# Altium footprint library pcb_Active.PcbLib: 86 footprints (part 3 of 6)
Each footprint in its own frame and in the unit in brackets; x right, y up, seen from the top. Pads: shape width x height; smd on the part's side, far side on the other; paste and mask are expansions set on the pad; w line width, h text height; cw(c..) or ccw(c..) is an arc to the next point about the centre after c.
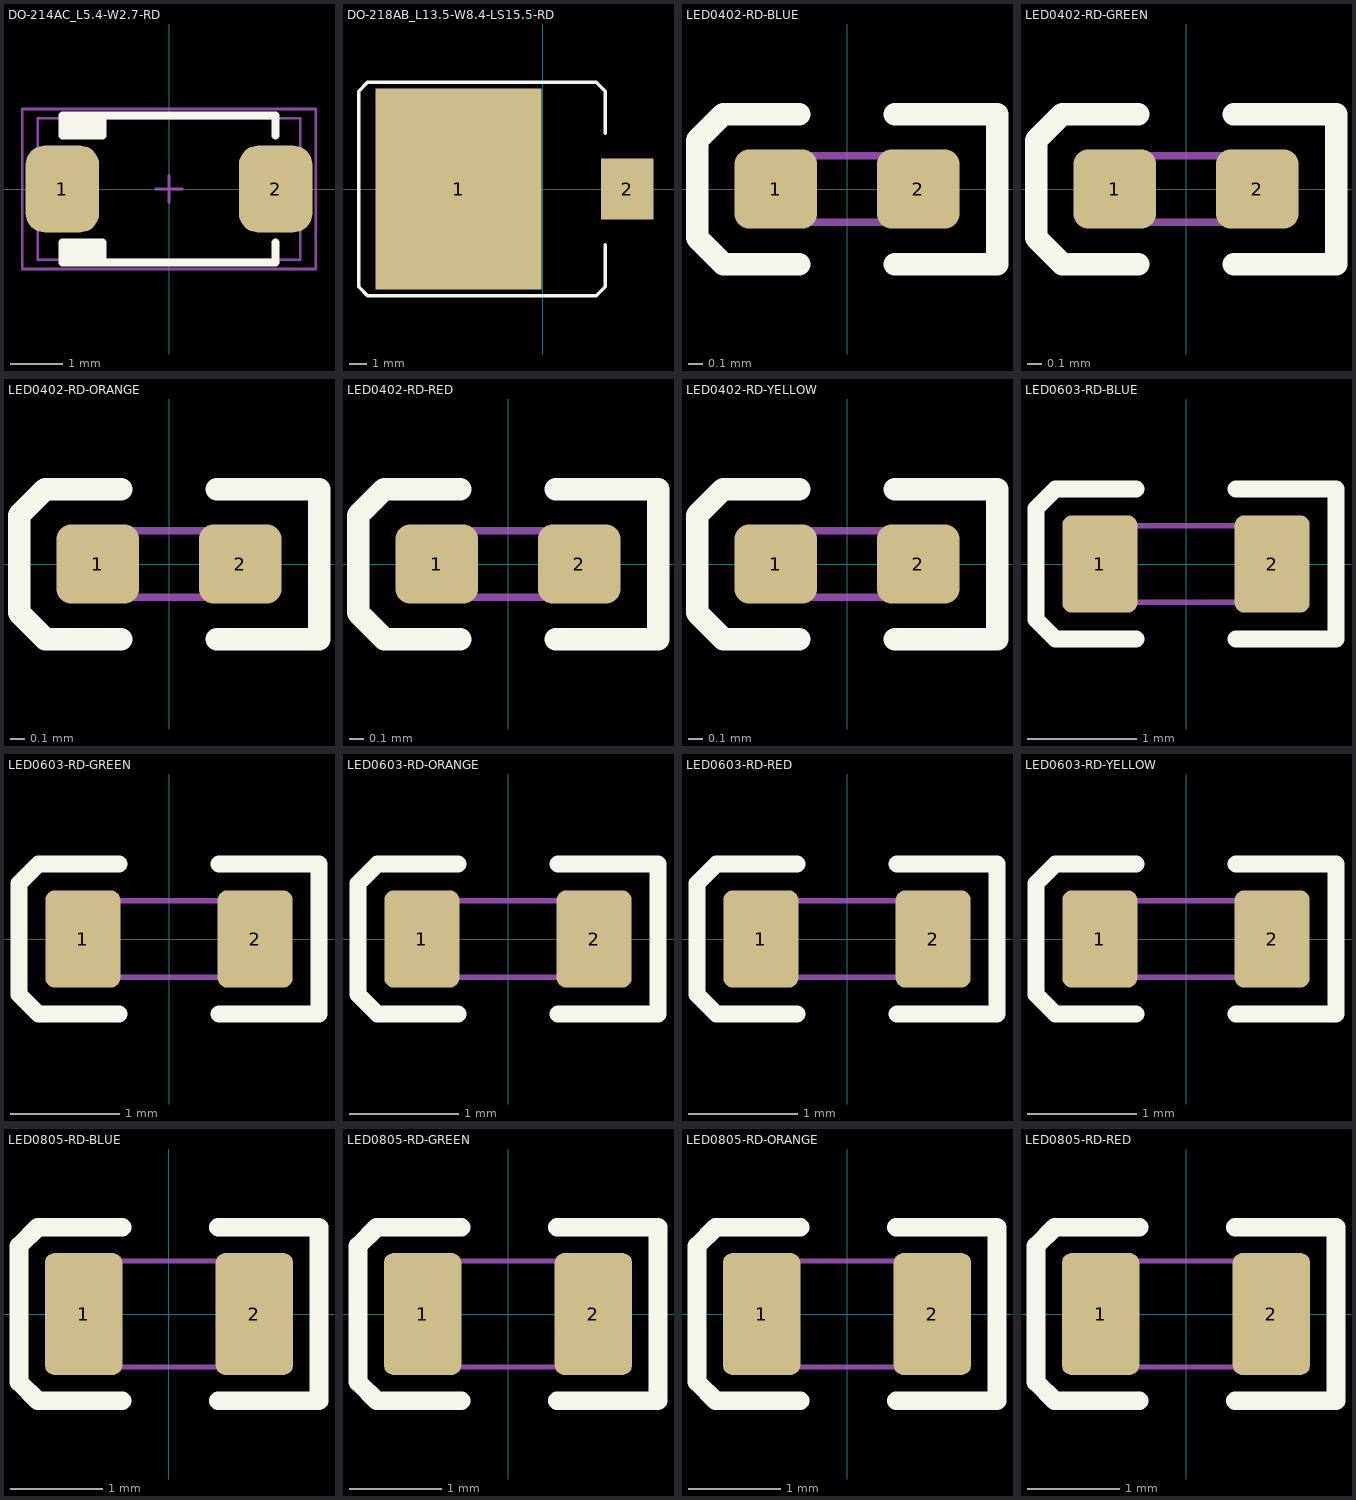
[diagram p2: the footprints below, top view; thin cyan lines are the x and y axes]

## DO-214AC_L5.4-W2.7-RD [mil] "SMA"
pads (2):
  rrect50% 55x65 smd: 1(-80,0) 2(80,0)
Top Overlay:
  region: -50,-40 -50,-55 -80,-55 -80,-40
  region: -50,40 -50,55 -80,55 -80,40
  lines w6: -50,-55 -50,-40 -80,-40 -80,-55 80,-55 80,-40 ; -50,55 -50,40 -80,40 -80,55 80,55 80,40
Mechanical 13:
  lines w2: -9.99,0.01 10.01,0.01 ; 0.01,-9.99 0.01,10.01 ; -98.44,-53.16 98.41,-53.16 98.41,53.14 -98.44,53.14 -98.44,-53.16
Mechanical 14:
  lines w2: -110,-60 -110,60 110,60 110,-60 -110,-60
Mechanical 16:
  text ".Designator" at 0,0 h39.37
3D body "User Library-DO-214AC_SMA.STEP": height 86.69, standoff 0.03, extent -98.43,-53.16 98.42,53.14

## DO-218AB_L13.5-W8.4-LS15.5-RD [mm] "长：13.7mm，宽：10.5mm，厚：5mm"
height 2.54
pads (2):
  rect 9.5x11.5 smd: 1(-4.826,0)
  rect 3x3.5 smd: 2(4.826,0)
Top Overlay:
  lines w0.2: 3.556,-3.175 3.556,-5.588 3.048,-6.096 -10.033,-6.096 -10.541,-5.588 -10.541,5.588 -10.033,6.096 3.048,6.096 3.556,5.588 3.556,3.175
Mechanical 15:
  circle w0.05: c-3.556,0 r0.35
  lines w0.05: -4.056,0 -3.056,0 ; -3.556,-0.5 -3.556,0.5
Mechanical 16:
  text ".Designator" at 0,0 h1
3D body "DO-218AB.STEP": height 5.02, standoff 0.02, extent -10.406,-5.25 5.794,5.25

## LED0402-RD-BLUE [mil]
height 31.5
pads (2):
  rrect36% 22x21 smd mask+3: 1(-19,0) 2(19,0)
Top Overlay:
  lines w6: -12.68,-20 -33,-20 -40,-13 -40,13 -33,20 -12.68,20 ; 12.68,-20 40,-20 40,20 12.68,20
Mechanical 11:
  lines w2.01: -18.7,-8.86 18.7,-8.86 18.7,8.86 -18.7,8.86 -18.7,-8.86
Mechanical 16:
  text ".Designator" at 0,0 h39.37
3D body "User Library-led_0402LED0402 blue_.STEP": height 17.72, standoff 0, extent -19.88,-9.84 19.88,9.84

## LED0402-RD-GREEN [mil]
height 31.5
pads (2):
  rrect36% 22x21 smd mask+3: 1(-19,0) 2(19,0)
Top Overlay:
  lines w6: -12.68,-20 -33,-20 -40,-13 -40,13 -33,20 -12.68,20 ; 12.68,-20 40,-20 40,20 12.68,20
Mechanical 11:
  lines w2.01: -18.7,-8.86 18.7,-8.86 18.7,8.86 -18.7,8.86 -18.7,-8.86
Mechanical 16:
  text ".Designator" at 0,0 h39.37
3D body "User Library-led_0402LED0402 green_.STEP": height 17.72, standoff 0, extent -19.88,-9.84 19.88,9.84

## LED0402-RD-ORANGE [mil]
height 31.5
pads (2):
  rrect36% 22x21 smd mask+3: 1(-19,0) 2(19,0)
Top Overlay:
  lines w6: -12.68,-20 -33,-20 -40,-13 -40,13 -33,20 -12.68,20 ; 12.68,-20 40,-20 40,20 12.68,20
Mechanical 11:
  lines w2.01: -18.7,-8.86 18.7,-8.86 18.7,8.86 -18.7,8.86 -18.7,-8.86
Mechanical 16:
  text ".Designator" at 0,0 h39.37
3D body "User Library-led_0402LED0402 orange_.STEP": height 17.72, standoff 0, extent -19.88,-9.84 19.88,9.84

## LED0402-RD-RED [mil]
height 31.5
pads (2):
  rrect36% 22x21 smd mask+3: 1(-19,0) 2(19,0)
Top Overlay:
  lines w6: -12.68,-20 -33,-20 -40,-13 -40,13 -33,20 -12.68,20 ; 12.68,-20 40,-20 40,20 12.68,20
Mechanical 11:
  lines w2.01: -18.7,-8.86 18.7,-8.86 18.7,8.86 -18.7,8.86 -18.7,-8.86
Mechanical 16:
  text ".Designator" at 0,0 h39.37
3D body "User Library-led_0402LED0402 red_.STEP": height 17.72, standoff 0, extent -19.88,-9.84 19.88,9.84

## LED0402-RD-YELLOW [mil]
height 31.5
pads (2):
  rrect36% 22x21 smd mask+3: 1(-19,0) 2(19,0)
Top Overlay:
  lines w6: -12.68,-20 -33,-20 -40,-13 -40,13 -33,20 -12.68,20 ; 12.68,-20 40,-20 40,20 12.68,20
Mechanical 11:
  lines w2.01: -18.7,-8.86 -18.7,8.86 18.7,8.86 18.7,-8.86 -18.7,-8.86
Mechanical 16:
  text ".Designator" at 0,0 h39.37
3D body "User Library-led_0402LED0402 yellow_.STEP": height 17.72, standoff 0, extent -19.88,-9.84 19.88,9.84

## LED0603-RD-BLUE [mil]
height 31.5
pads (2):
  rrect25% 27x35 smd mask+3: 1(-31,0) 2(31,0)
Top Overlay:
  lines w6: -18,-27 -47,-27 -54,-20 -54,20 -47,27 -18,27 ; 18,-27 54,-27 54,27 18,27
Mechanical 11:
  lines w2.01: -29.53,-13.78 -29.53,13.78 29.53,13.78 29.53,-13.78 -29.53,-13.78
Mechanical 16:
  text ".Designator" at 0,0 h39.37
3D body "User Library-led_0603LED0603 blue.STEP": height 23.62, standoff 0, extent -31.89,-15.75 31.89,15.75

## LED0603-RD-GREEN [mil]
height 31.5
pads (2):
  rrect25% 27x35 smd mask+3: 1(-31,0) 2(31,0)
Top Overlay:
  lines w6: -18,-27 -47,-27 -54,-20 -54,20 -47,27 -18,27 ; 18,-27 54,-27 54,27 18,27
Mechanical 11:
  lines w2.01: -29.53,-13.78 29.53,-13.78 29.53,13.78 -29.53,13.78 -29.53,-13.78
Mechanical 16:
  text ".Designator" at 0,0 h39.37
3D body "User Library-led_0603LED0603 green.STEP": height 23.62, standoff 0, extent -31.89,-15.75 31.89,15.75

## LED0603-RD-ORANGE [mil]
height 31.5
pads (2):
  rrect25% 27x35 smd mask+3: 1(-31,0) 2(31,0)
Top Overlay:
  lines w6: -18,-27 -47,-27 -54,-20 -54,20 -47,27 -18,27 ; 18,-27 54,-27 54,27 18,27
Mechanical 11:
  lines w2.01: -29.53,-13.78 29.53,-13.78 29.53,13.78 -29.53,13.78 -29.53,-13.78
Mechanical 16:
  text ".Designator" at 0,0 h39.37
3D body "User Library-led_0603LED0603 orange_.STEP": height 23.62, standoff 0, extent -31.89,-15.75 31.89,15.75

## LED0603-RD-RED [mil]
height 31.5
pads (2):
  rrect25% 27x35 smd mask+3: 1(-31,0) 2(31,0)
Top Overlay:
  lines w6: -18,-27 -47,-27 -54,-20 -54,20 -47,27 -18,27 ; 18,-27 54,-27 54,27 18,27
Mechanical 11:
  lines w2.01: -29.53,-13.78 29.53,-13.78 29.53,13.78 -29.53,13.78 -29.53,-13.78
Mechanical 16:
  text ".Designator" at 0,0 h39.37
3D body "User Library-led_0603LED0603 red.STEP": height 23.62, standoff 0, extent -31.89,-15.75 31.89,15.75

## LED0603-RD-YELLOW [mil]
height 31.5
pads (2):
  rrect25% 27x35 smd mask+3: 1(-31,0) 2(31,0)
Top Overlay:
  lines w6: -18,-27 -47,-27 -54,-20 -54,20 -47,27 -18,27 ; 18,-27 54,-27 54,27 18,27
Mechanical 11:
  lines w2.01: -29.53,-13.78 29.53,-13.78 29.53,13.78 -29.53,13.78 -29.53,-13.78
Mechanical 16:
  text ".Designator" at 0,0 h39.37
3D body "User Library-led_0603LED0603 yellow_.STEP": height 23.62, standoff 0, extent -31.89,-15.75 31.89,15.75

## LED0805-RD-BLUE [mil]
height 47.24
pads (2):
  rrect24% 33x52 smd mask+3: 1(-36.42,0) 2(36.42,0)
Top Overlay:
  lines w8: -20,-37 -56,-37 -64,-29 -64,29 -56,37 -20,37 ; 21,-37 64,-37 64,37 21,37
Mechanical 11:
  lines w2.01: -37.4,-22.64 37.4,-22.64 37.4,22.64 -37.4,22.64 -37.4,-22.64
Mechanical 16:
  text ".Designator" at 0,0 h39.37
3D body "User Library-led_0805LED0805_blue.STEP": height 43.31, standoff 0, extent -39.76,-24.61 39.76,24.61

## LED0805-RD-GREEN [mil]
height 47.24
pads (2):
  rrect24% 33x52 smd mask+3: 1(-36.42,0) 2(36.42,0)
Top Overlay:
  lines w8: -20,-37 -56,-37 -64,-29 -64,29 -56,37 -20,37 ; 21,-37 64,-37 64,37 21,37
Mechanical 11:
  lines w2.01: -37.4,-22.64 37.4,-22.64 37.4,22.64 -37.4,22.64 -37.4,-22.64
Mechanical 16:
  text ".Designator" at 0,0 h39.37
3D body "User Library-led_0805LED0805_green.STEP": height 43.31, standoff 0, extent -39.76,-24.61 39.76,24.61

## LED0805-RD-ORANGE [mil]
height 47.24
pads (2):
  rrect24% 33x52 smd mask+3: 1(-36.42,0) 2(36.42,0)
Top Overlay:
  lines w8: -20,-37 -56,-37 -64,-29 -64,29 -56,37 -20,37 ; 21,-37 64,-37 64,37 21,37
Mechanical 11:
  lines w2.01: -37.4,-22.64 -37.4,22.64 37.4,22.64 37.4,-22.64 -37.4,-22.64
Mechanical 16:
  text ".Designator" at 0,0 h39.37
3D body "User Library-led_0805LED0805_orange.STEP": height 43.31, standoff 0, extent -39.76,-24.61 39.76,24.61

## LED0805-RD-RED [mil]
height 47.24
pads (2):
  rrect24% 33x52 smd mask+3: 1(-36.42,0) 2(36.42,0)
Top Overlay:
  lines w8: -20,-37 -56,-37 -64,-29 -64,29 -56,37 -20,37 ; 21,-37 64,-37 64,37 21,37
Mechanical 11:
  lines w2.01: -37.4,-22.64 37.4,-22.64 37.4,22.64 -37.4,22.64 -37.4,-22.64
Mechanical 16:
  text ".Designator" at 0,0 h39.37
3D body "User Library-led_0805LED0805_blue.STEP": height 43.31, standoff 0, extent -39.76,-24.61 39.76,24.61